# Altium footprint library 常用元件封装库.PcbLib: 1310 footprints (part 57 of 83)
Each footprint in its own frame and in the unit in brackets; x right, y up, seen from the top. Pads: shape width x height; smd on the part's side, far side on the other; paste and mask are expansions set on the pad; w line width, h text height; cw(c..) or ccw(c..) is an arc to the next point about the centre after c.
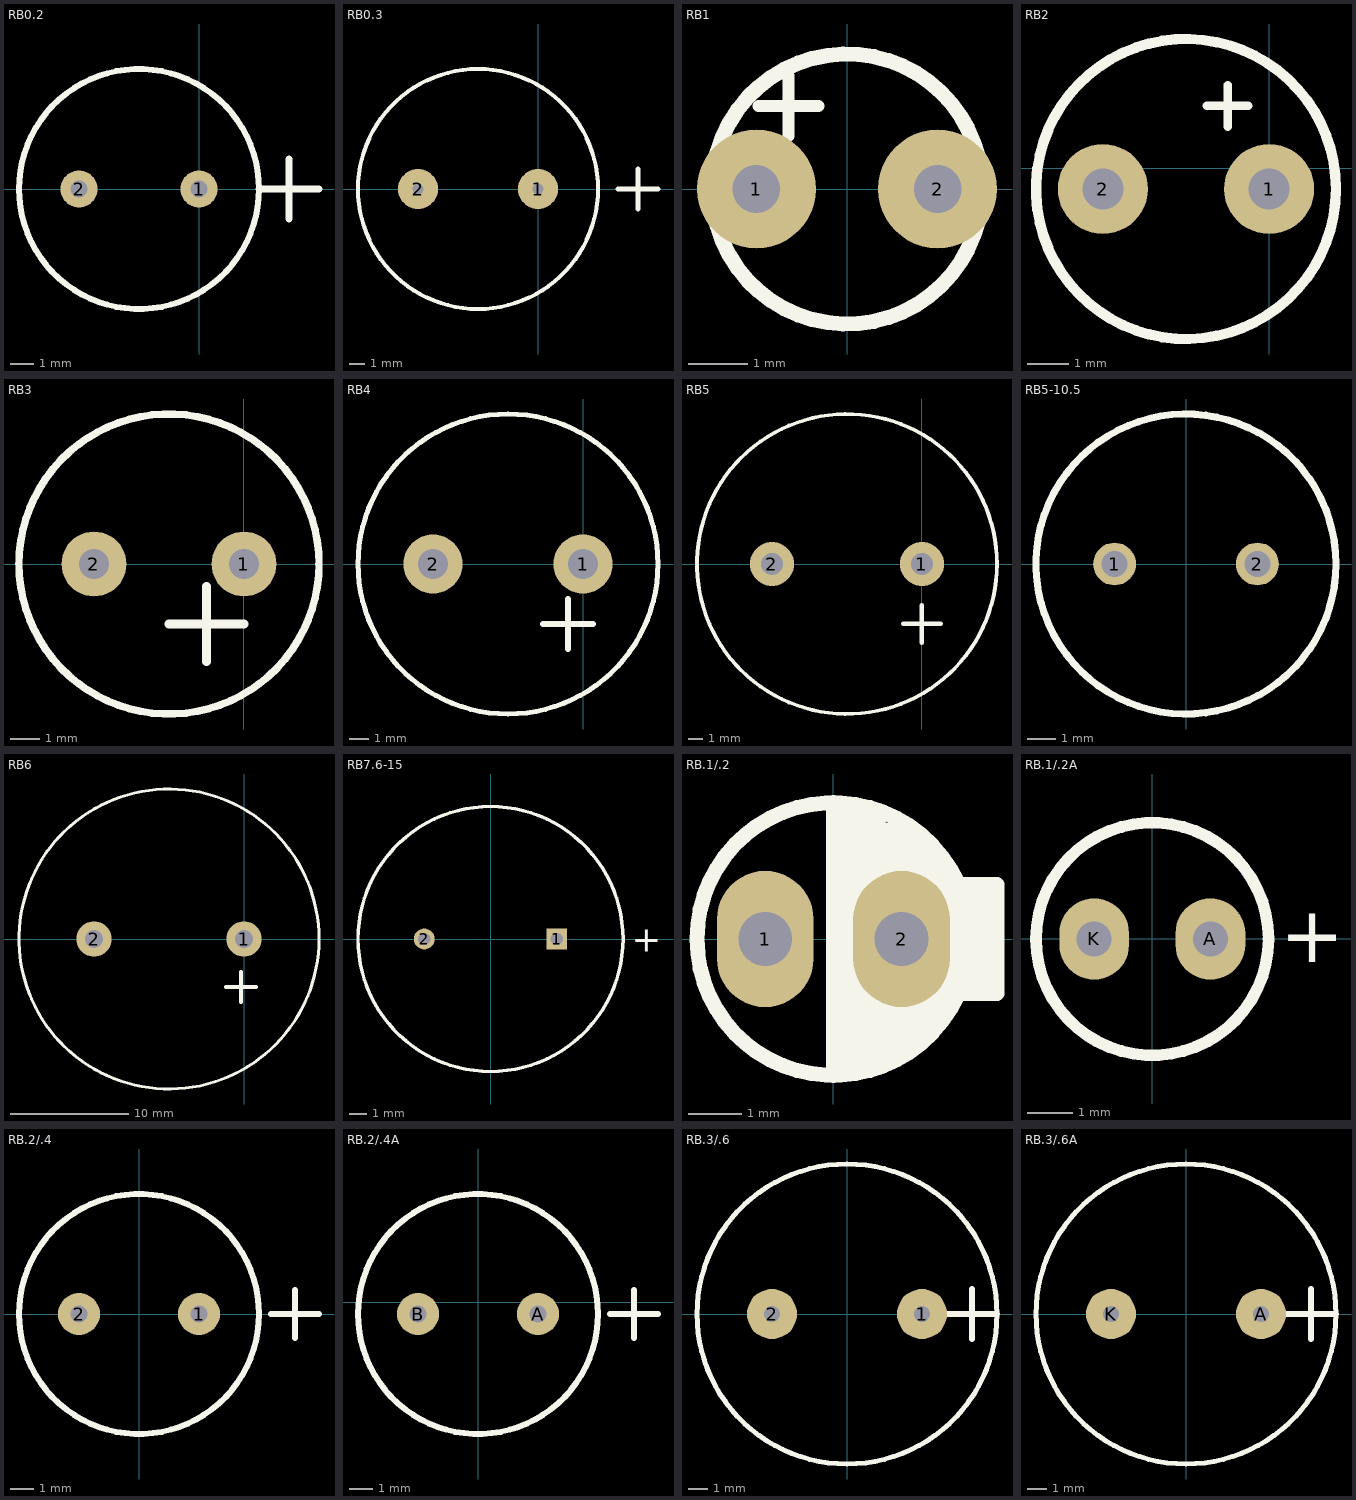
[diagram p56: the footprints below, top view; thin cyan lines are the x and y axes]

## RB0.2 [mil]
pads (2):
  round 62 hole 28: 1(0,0) 2(-200,0)
Top Overlay:
  circle w10: c-100,0 r200
  lines w12: 100,0 200,0 ; 150,-50 150,50

## RB0.3 [mil]
pads (2):
  round 100 hole 28: 1(0,0) 2(-300,0)
Top Overlay:
  circle w10: c-150,0 r300
  lines w12: 200,0 300,0 ; 250,-50 250,50

## RB1 [mm]
pads (2):
  round 2 hole 0.8: 1(-1.524,0) 2(1.524,0)
Top Overlay:
  circle w0.254: c0,0 r2.272
  lines w0.203: -1.492,1.4 -0.476,1.4 ; -0.984,0.892 -0.984,1.908

## RB2 [mm]
pads (2):
  round 2.2 hole 1: 1(0,-0.508) 2(-4.064,-0.508)
Top Overlay:
  circle w0.254: c-2.032,-0.508 r3.663
  lines w0.203: -1.524,1.524 -0.508,1.524 ; -1.016,1.016 -1.016,2.032

## RB3 [mm]
pads (2):
  round 2.2 hole 1: 1(0,0) 2(-5.08,0)
Top Overlay:
  circle w0.254: c-2.54,0 r5.08
  lines w0.305: -2.54,-2.032 0,-2.032 ; -1.27,-3.302 -1.27,-0.762

## RB4 [mm]
pads (2):
  round 3 hole 1.5: 1(0,0) 2(-7.62,0)
Top Overlay:
  circle w0.254: c-3.81,0 r7.62
  lines w0.305: -2.032,-3.048 0.508,-3.048 ; -0.762,-4.318 -0.762,-1.778

## RB5 [mm]
pads (2):
  round 3 hole 1.5: 1(0,0) 2(-10.16,0)
Top Overlay:
  circle w0.254: c-5.08,0 r10.16
  lines w0.305: -1.27,-4.064 1.27,-4.064 ; 0,-5.334 0,-2.794

## RB5-10.5 [mm] "Motor, General Kind; 2 Leads"
pads (2):
  round 1.5 hole 0.9: 1(-2.5,0) 2(2.5,0)
Top Overlay:
  circle w0.25: c0,0 r5.25
Mechanical 1:
  circle w0.02: c0,0 r5.25

## RB6 [mm]
pads (2):
  round 3 hole 1.5: 1(0,0) 2(-12.7,0)
Top Overlay:
  circle w0.254: c-6.35,0 r12.7
  lines w0.305: -1.524,-4.064 1.016,-4.064 ; -0.254,-5.334 -0.254,-2.794

## RB7.6-15 [mm] "Polarized Capacitor (Radial); 2 Leads"
pads (2):
  rect 1.2x1.2 hole 0.7: 1(3.81,0)
  round 1.2 hole 0.7: 2(-3.81,0)
Top Overlay:
  circle w0.2: c0,0 r7.62
  text "+" at 8.132,-0.737 h1.5

## RB.1/.2 [mm]
pads (2):
  oval 1.8x2.54 hole 1: 1(-1.27,0) 2(1.27,0)
Top Overlay:
  circle w0.279: c0,0 r2.54
  lines w0.279: 0,-2.54 0,2.54 ; 0,-2.032 1.524,-2.032 ; 0,-1.778 1.651,-1.778 ; 0,-1.524 1.905,-1.524 ; 0,-1.27 2.032,-1.27 ; 0,-1.016 3.048,-1.016 3.048,1.016 0,1.016 ; 0,-0.762 3.048,-0.762 ; 0,-0.508 3.048,-0.508 ; 0,-0.254 3.048,-0.254 ; 0,0 3.048,0 ; 0,0.254 3.048,0.254 ; 0,0.508 3.048,0.508 ; 0,0.762 3.048,0.762 ; 0,1.27 2.032,1.27 ; 0,1.524 1.905,1.524 ; 0,1.778 1.651,1.778 ; 0,2.032 1.397,2.032 ; 0,2.286 0.889,2.286 ; 0.127,-2.286 1.016,-2.286
Bottom Overlay:
  circle w0.254: c0,0 r2.54
  text "+" at -0.889,1.143 h1.2
  text "-" at 0.381,1.143 h1.2
3D body "SW3DPS-ELECTROLITIC CAPACITOR RADIAL 5X11-DEFAULT.STEP": height 11, standoff -2.5, extent -2.754,-2.5 2.246,2.5

## RB.1/.2A [mil]
pads (2):
  oval 60x70 hole 30: A(50,0) K(-50,0)
Top Overlay:
  circle w10: c0,0 r100
  text "+" at 110,-20 h48

## RB.2/.4 [mil]
pads (2):
  round 70 hole 28: 1(100,0) 2(-100,0)
Top Overlay:
  circle w10: c0,0 r200
  lines w10: 220,0 300,0 ; 260,-40 260,40

## RB.2/.4A [mil]
pads (2):
  round 70 hole 28: A(100,-20) B(-100,-20)
Top Overlay:
  circle w10: c0,-20 r200
  lines w10: 220,-20 300,-20 ; 260,-60 260,20

## RB.3/.6 [mil]
pads (2):
  round 100 hole 32: 1(150,0) 2(-150,0)
Top Overlay:
  circle w10: c0,0 r300
  lines w12: 200,0 300,0 ; 250,-50 250,50

## RB.3/.6A [mil]
pads (2):
  round 100 hole 32: A(150,0) K(-150,0)
Top Overlay:
  circle w10: c0,0 r300
  lines w12: 200,0 300,0 ; 250,-50 250,50